# Altium footprint library LegacySMD-RCL.PcbLib: 110 footprints (part 1 of 7)
Each footprint in its own frame and in the unit in brackets; x right, y up, seen from the top. Pads: shape width x height; smd on the part's side, far side on the other; paste and mask are expansions set on the pad; w line width, h text height; cw(c..) or ccw(c..) is an arc to the next point about the centre after c.
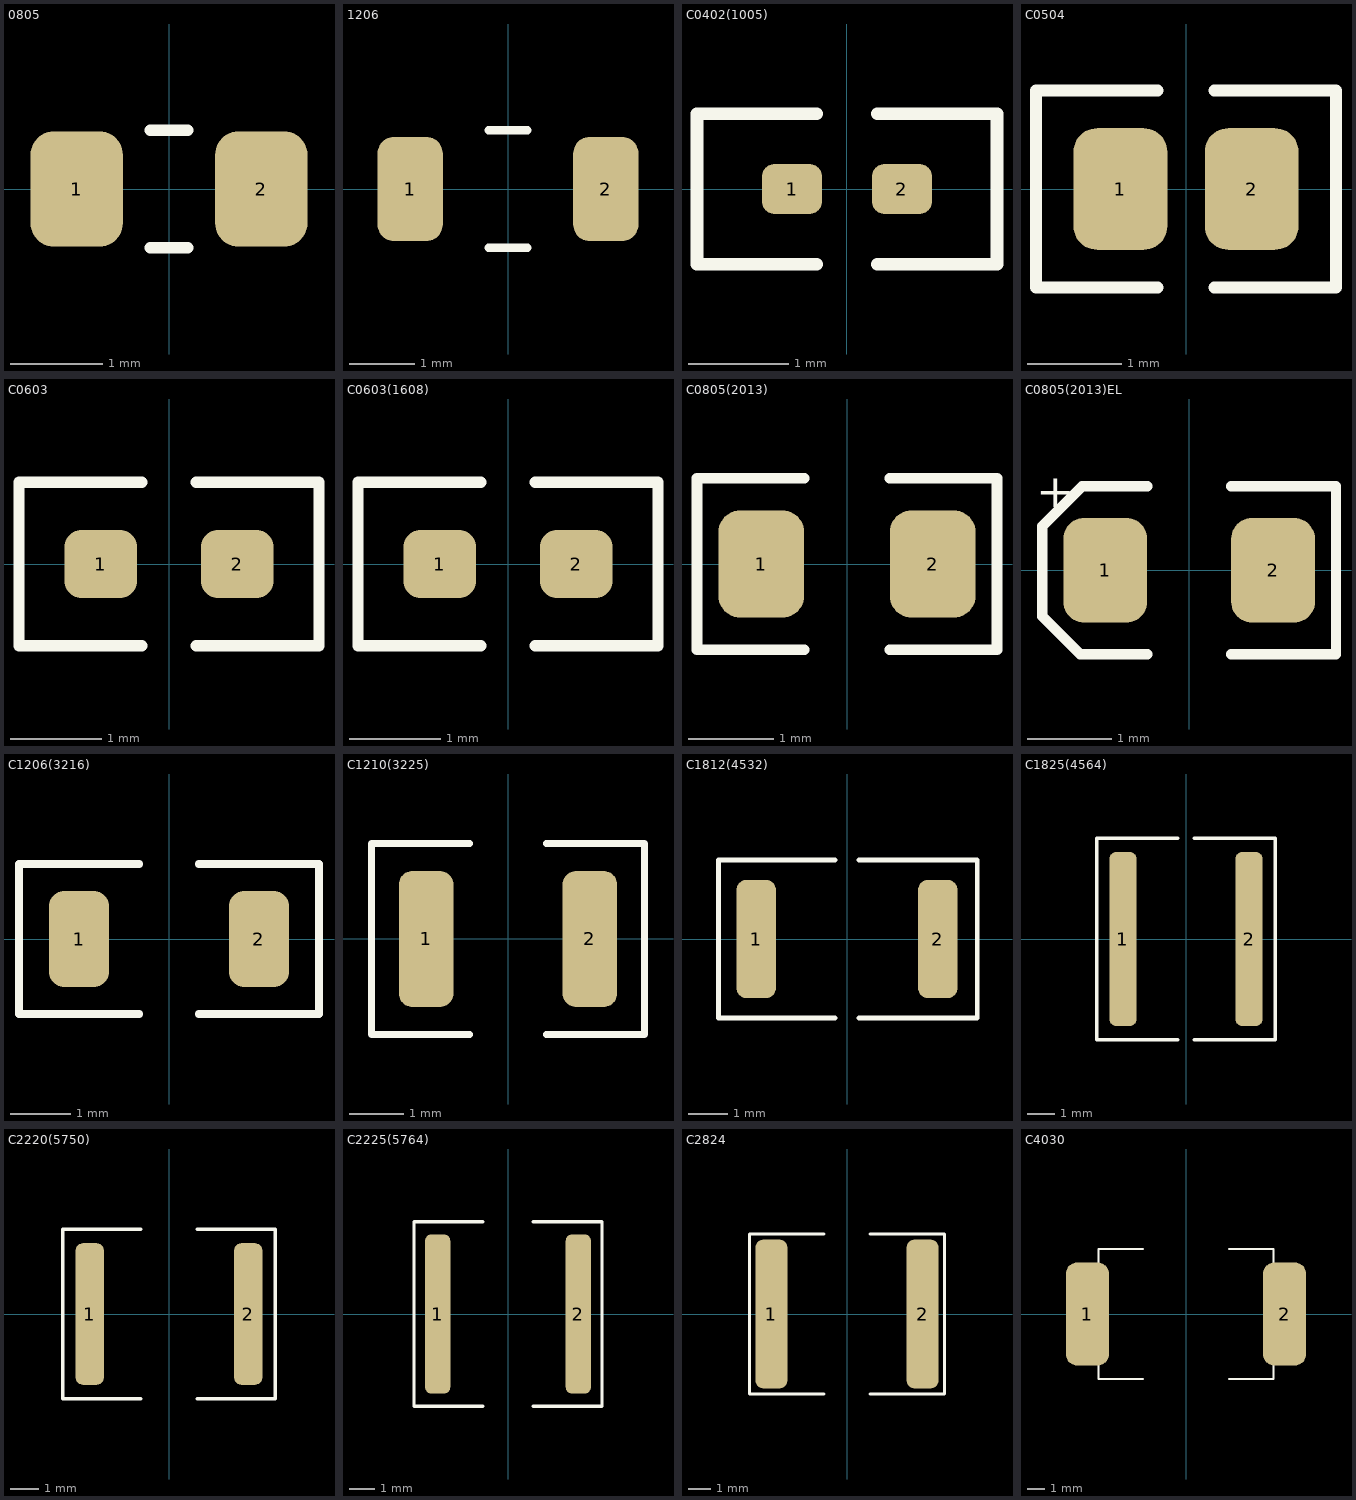
[diagram p0: the footprints below, top view; thin cyan lines are the x and y axes]

## 0805 [mm] "Metal Electrode Face (MELF) Resistor; Body 2 x 1.4 mm (LxDia)"
height 1.45
pads (2):
  rrect50% 1x1.25 smd: 1(-1,0) 2(1,0)
Top Overlay:
  lines w0.125: -0.203,-0.635 0.203,-0.635 ; -0.203,0.635 0.203,0.635
3D body "R-0805a.step": height 0.47, standoff 0, extent -1,-0.625 1,0.627

## 1206 [mm] "Metal Electrode Face (MELF) Resistor; Body 3.2 x 1.8 mm (LxDia)"
height 1.85
pads (2):
  rrect50% 1x1.6 smd mask+0.102: 1(-1.5,0) 2(1.5,0)
Top Overlay:
  lines w0.125: -0.3,-0.9 0.3,-0.9 ; -0.3,0.9 0.3,0.9
3D body "R-1206.STEP": height 1, standoff 0, extent -1.625,-0.8 1.575,0.8

## C0402(1005) [mm]
pads (2):
  rrect50% 0.6x0.5 smd: 1(-0.55,0) 2(0.55,0)
Top Overlay:
  lines w0.125: -0.3,-0.75 -1.5,-0.75 -1.5,0.75 -0.3,0.75 ; 0.3,-0.75 1.5,-0.75 1.5,0.75 0.3,0.75
3D body "C-0402.STEP": height 0.2, standoff 0, extent -0.5,-0.3 0.5,0.3

## C0504 [mm]
pads (2):
  rrect50% 1x1.3 smd: 1(-0.7,0) 2(0.7,0)
Top Overlay:
  lines w0.125: -0.3,-1.05 -1.6,-1.05 -1.6,1.05 -0.3,1.05 ; 0.3,-1.05 1.6,-1.05 1.6,1.05 0.3,1.05

## C0603 [mm] "(1608) Metric"
pads (2):
  rrect50% 0.8x0.75 smd: 1(-0.75,0) 2(0.75,0)
Top Overlay:
  lines w0.125: -0.3,-0.9 -1.65,-0.9 -1.65,0.9 -0.3,0.9 ; 0.3,-0.9 1.65,-0.9 1.65,0.9 0.3,0.9
3D body "C-0603.STEP": height 0.3, standoff 0, extent -0.8,-0.4 0.8,0.4

## C0603(1608) [mm]
pads (2):
  rrect50% 0.8x0.75 smd: 1(-0.75,0) 2(0.75,0)
Top Overlay:
  lines w0.125: -0.3,-0.9 -1.65,-0.9 -1.65,0.9 -0.3,0.9 ; 0.3,-0.9 1.65,-0.9 1.65,0.9 0.3,0.9
3D body "C-0603.STEP": height 0.3, standoff 0, extent -0.8,-0.4 0.8,0.4

## C0805(2013) [mm]
pads (2):
  rrect50% 1x1.25 smd: 1(-1,0) 2(1,0)
Top Overlay:
  lines w0.125: -0.5,-1 -1.75,-1 -1.75,1 -0.5,1 ; 0.5,-1 1.75,-1 1.75,1 0.5,1
3D body "C-0805.STEP": height 0.73, standoff -0.05, extent -1,-0.625 1,0.625

## C0805(2013)EL [mm]
pads (2):
  rrect50% 1x1.25 smd: 1(-1,0) 2(1,0)
Top Overlay:
  lines w0.125: -0.5,-1 -1.3,-1 -1.75,-0.55 -1.75,0.525 -1.275,1 -0.5,1 ; 0.5,-1 1.75,-1 1.75,1 0.5,1
  text "+" at -1.825,0.75 h0.4
3D body "C-0805.STEP": height 0.73, standoff -0.05, extent -1,-0.625 1,0.625

## C1206(3216) [mm]
pads (2):
  rrect50% 1x1.6 smd: 1(-1.5,0) 2(1.5,0)
Top Overlay:
  lines w0.125: -0.5,-1.25 -2.5,-1.25 -2.5,1.25 -0.5,1.25 ; 0.5,-1.25 2.5,-1.25 2.5,1.25 0.5,1.25
3D body "C-1206.STEP": height 1, standoff 0, extent -1.6,-0.8 1.6,0.8

## C1210(3225) [mm]
pads (2):
  rrect50% 1x2.5 smd: 1(-1.5,0) 2(1.5,0)
Top Overlay:
  lines w0.125: -0.7,-1.75 -2.5,-1.75 -2.5,1.75 -0.7,1.75 ; 0.7,-1.75 2.5,-1.75 2.5,1.75 0.7,1.75
3D body "R-1210a.step": height 0.47, standoff 0, extent -1.55,-1.301 1.55,1.301

## C1812(4532) [mm]
pads (2):
  rrect50% 1x3 smd: 1(-2.3,0) 2(2.3,0)
Top Overlay:
  lines w0.125: -0.3,-2 -3.25,-2 -3.25,2 -0.3,2 ; 0.3,-2 3.3,-2 3.3,2 0.3,2

## C1825(4564) [mm]
pads (2):
  rrect50% 1x6.35 smd: 1(-2.3,0) 2(2.3,0)
Top Overlay:
  lines w0.125: -0.3,-3.675 -3.25,-3.675 -3.25,3.675 -0.3,3.675 ; 0.3,-3.675 3.25,-3.675 3.25,3.675 0.3,3.675

## C2220(5750) [mm]
pads (2):
  rrect50% 1x5 smd: 1(-2.8,0) 2(2.8,0)
Top Overlay:
  lines w0.125: -1,-3 -3.75,-3 -3.75,3 -1,3 ; 1,-3 3.75,-3 3.75,3 1,3

## C2225(5764) [mm]
pads (2):
  rrect50% 1x6.35 smd: 1(-2.8,0) 2(2.8,0)
Top Overlay:
  lines w0.125: -1,-3.675 -3.75,-3.675 -3.75,3.675 -1,3.675 ; 1,-3.675 3.75,-3.675 3.75,3.675 1,3.675

## C2824 [mm]
pads (2):
  rrect50% 1.4x6.5 smd: 1(-3.3,0) 2(3.3,0)
Top Overlay:
  lines w0.125: -1,-3.5 -4.25,-3.5 -4.25,3.5 -1,3.5 ; 1,-3.5 4.25,-3.5 4.25,3.5 1,3.5
3D body "C-2824.STEP": height 3, standoff 0, extent -3.6,-3.05 3.6,3.05

## C4030 [mm]
pads (2):
  rrect50% 2.5x6 smd: 1(-5.75,0) 2(5.75,0)
Top Overlay:
  lines w0.125: -2.5,-3.8 -5.1,-3.8 -5.1,3.8 -2.5,3.8 ; 2.5,-3.8 5.1,-3.8 5.1,3.8 2.5,3.8
3D body "C-4030.STEP": height 5, standoff 0, extent -5.1,-3.8 5.1,3.8